# Altium footprint library PCB_Lib_Devzone.PcbLib: 491 footprints (part 7 of 31)
Each footprint in its own frame and in the unit in brackets; x right, y up, seen from the top. Pads: shape width x height; smd on the part's side, far side on the other; paste and mask are expansions set on the pad; w line width, h text height; cw(c..) or ccw(c..) is an arc to the next point about the centre after c.
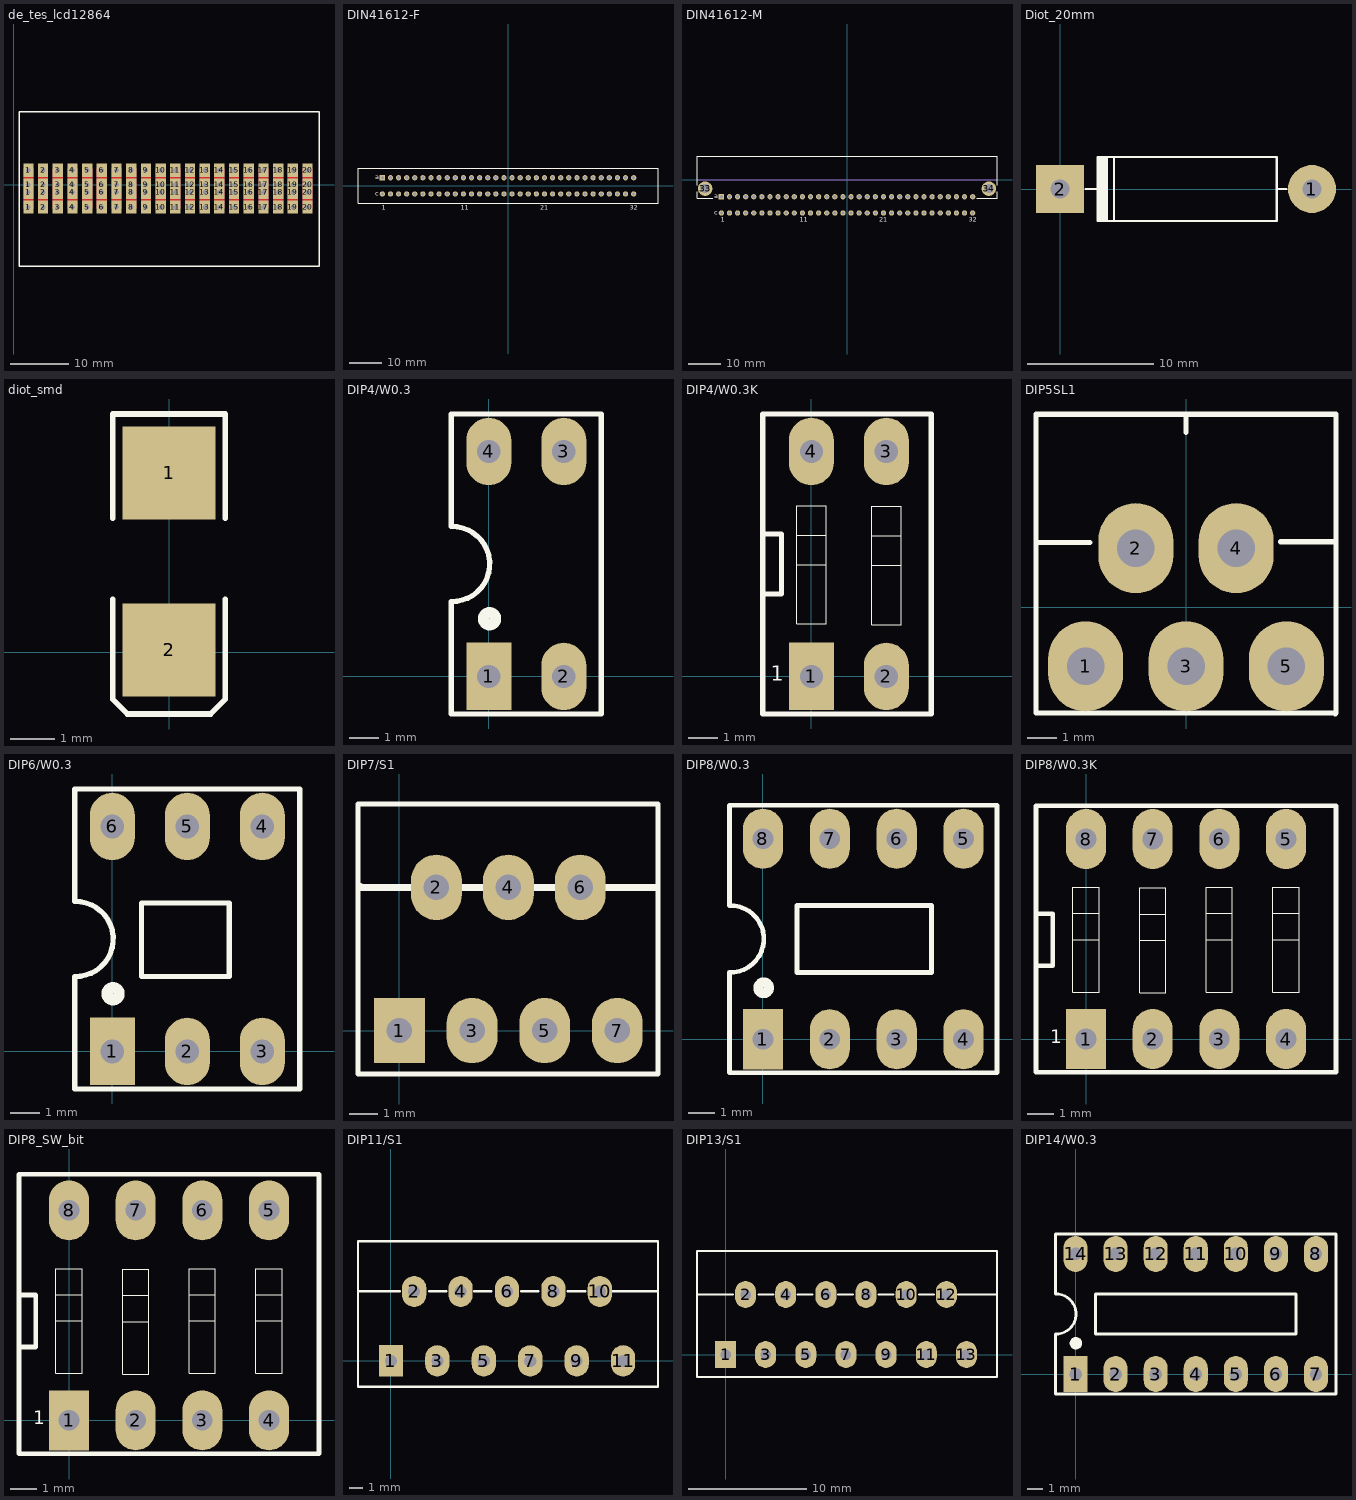
[diagram p6: the footprints below, top view; thin cyan lines are the x and y axes]

## de_tes_lcd12864 [mil]
pads (80):
  rect 70x90 hole 31.5: 1(100,-151.18) 1(100,-51.18) 1(100,0) 1(100,100) 2(200,-151.18) 2(200,-51.18) 2(200,0) 2(200,100) 3(300,-151.18) 3(300,-51.18) 3(300,0) 3(300,100) 4(400,-151.18) 4(400,-51.18) 4(400,0) 4(400,100) 5(500,-151.18) 5(500,-51.18) 5(500,0) 5(500,100) 6(600,-151.18) 6(600,-51.18) 6(600,0) 6(600,100) 7(700,-151.18) 7(700,-51.18) 7(700,0) 7(700,100) 8(800,-151.18) 8(800,-51.18) 8(800,0) 8(800,100) 9(900,-151.18) 9(900,-51.18) 9(900,0) 9(900,100) 10(1000,-151.18) 10(1000,-51.18) 10(1000,0) 10(1000,100) 11(1100,-151.18) 11(1100,-51.18) 11(1100,0) 11(1100,100) 12(1200,-151.18) 12(1200,-51.18) 12(1200,0) 12(1200,100) 13(1300,-151.18) 13(1300,-51.18) 13(1300,0) 13(1300,100) 14(1400,-151.18) 14(1400,-51.18) 14(1400,0) 14(1400,100) 15(1500,-151.18) 15(1500,-51.18) 15(1500,0) 15(1500,100) 16(1600,-151.18) 16(1600,-51.18) 16(1600,0) 16(1600,100) 17(1700,-151.18) 17(1700,-51.18) 17(1700,0) 17(1700,100) 18(1800,-151.18) 18(1800,-51.18) 18(1800,0) 18(1800,100) 19(1900,-151.18) 19(1900,-51.18) 19(1900,0) 19(1900,100) 20(2000,-151.18) 20(2000,-51.18) 20(2000,0) 20(2000,100)
Top Layer:
  lines w70: 100,-151.18 100,100 ; 200,-151.18 200,100 ; 300,-151.18 300,100 ; 400,-151.18 400,100 ; 500,-151.18 500,100 ; 600,-151.18 600,100 ; 700,-151.18 700,100 ; 800,-151.18 800,100 ; 900,-151.18 900,100 ; 1000,-151.18 1000,100 ; 1100,-151.18 1100,100 ; 1200,-151.18 1200,100 ; 1300,-151.18 1300,100 ; 1400,-151.18 1400,100 ; 1500,-151.18 1500,100 ; 1600,-151.18 1600,100 ; 1700,-151.18 1700,100 ; 1800,-151.18 1800,100 ; 1900,-151.18 1900,100 ; 2000,-151.18 2000,100
Bottom Layer:
  lines w50: 1500,-151.18 1500,-51.18 1500,0 ; 1600,-151.18 1600,-51.18 1600,100 ; 1700,-151.18 1700,100 ; 1802,-151.18 1802,114 ; 1900,-151.18 1900,100 ; 2000,-151.18 2000,-51.18 ; 2000,100 2000,0 ; 2000,-51.18 2000,0 ; 2000,-51.18 2000,0
  lines w70: 100,-151.18 100,100 ; 200,-151.18 200,100 ; 300,-151.18 300,100 ; 400,-151.18 400,100 ; 500,-151.18 500,100 ; 600,-151.18 600,100 ; 700,-151.18 700,100 ; 800,-151.18 800,100 ; 900,-151.18 900,100 ; 1000,-151.18 1000,100 ; 1100,-151.18 1100,100 ; 1200,-151.18 1200,100 ; 1300,-151.18 1300,100 ; 1400,-151.18 1400,100 ; 1500,-151.18 1500,-51.18 ; 1500,-5 1500,100 ; 1600,-151.18 1600,-51.18 ; 1600,0 1600,100 ; 1700,-151.18 1700,-51.18 ; 1700,0 1700,100 ; 1800,-151.18 1800,-51.18 ; 1800,0 1800,100 ; 1900,-151.18 1900,-51.18 ; 1900,0 1900,100 ; 2000,-151.18 2000,100
Top Overlay:
  lines w10: 36,-555 2078,-555 2078,499 1600,499 36,499 36,-555
3D body "female_header_a-bl254-da-g04d.stp": height 198.43, standoff -124.41, extent 44.16,-10.03 254,486.03
3D body "female_header_a-bl254-da-g04d.stp": height 198.43, standoff -124.41, extent 247,-10.03 456.84,486.03
3D body "female_header_a-bl254-da-g04d.stp": height 198.43, standoff -124.41, extent 448,-10.03 657.84,486.03
3D body "female_header_a-bl254-da-g04d.stp": height 198.43, standoff -124.41, extent 650,-10.03 859.84,486.03
3D body "female_header_a-bl254-da-g04d.stp": height 198.43, standoff -124.41, extent 1045.16,-10.03 1255,486.03
3D body "female_header_a-bl254-da-g04d.stp": height 198.43, standoff -124.41, extent 1246,-10.03 1455.84,486.03
3D body "female_header_a-bl254-da-g04d.stp": height 198.43, standoff -124.41, extent 1446,-10.03 1655.84,486.03
3D body "female_header_a-bl254-da-g04d.stp": height 198.43, standoff -124.41, extent 1641.16,-10.03 1851,486.03
3D body "female_header_a-bl254-da-g04d.stp": height 198.43, standoff -124.41, extent 1852.16,-10.03 2062,486.03
3D body "female_header_a-bl254-da-g04d.stp": height 198.43, standoff -124.41, extent 841,-10.03 1050.84,486.03
3D body "female_header_a-bl254-da-g04d.stp": height 198.43, standoff -124.41, extent 1048.6,-540.03 1258.45,-43.97
3D body "female_header_a-bl254-da-g04d.stp": height 198.43, standoff -124.41, extent 44.16,-540.03 254,-43.97
3D body "female_header_a-bl254-da-g04d.stp": height 198.43, standoff -124.41, extent 245.05,-540.03 454.89,-43.97
3D body "female_header_a-bl254-da-g04d.stp": height 198.43, standoff -124.41, extent 445.94,-540.03 655.78,-43.97
3D body "female_header_a-bl254-da-g04d.stp": height 198.43, standoff -124.41, extent 646.83,-540.03 856.67,-43.97
3D body "female_header_a-bl254-da-g04d.stp": height 198.43, standoff -124.41, extent 847.71,-540.03 1057.56,-43.97
3D body "female_header_a-bl254-da-g04d.stp": height 198.43, standoff -124.41, extent 1249.49,-540.03 1459.33,-43.97
3D body "female_header_a-bl254-da-g04d.stp": height 198.43, standoff -124.41, extent 1450.38,-540.03 1660.22,-43.97
3D body "female_header_a-bl254-da-g04d.stp": height 198.43, standoff -124.41, extent 1651.27,-540.03 1861.11,-43.97
3D body "female_header_a-bl254-da-g04d.stp": height 198.43, standoff -124.41, extent 1852.16,-540.03 2062,-43.97

## DIN41612-F [mm] "Connector; DIN 41612, Type C, Thru-Hole; Rows a+c, 64 Position; Vertical; No Mounting Fixture"
height 13
pads (64):
  rect 1.65x1.65 hole 1: A1(-39.37,2.54)
  round 1.65 hole 1: A2(-36.83,2.54) A3(-34.29,2.54) A4(-31.75,2.54) A5(-29.21,2.54) A6(-26.67,2.54) A7(-24.13,2.54) A8(-21.59,2.54) A9(-19.05,2.54) A10(-16.51,2.54) A11(-13.97,2.54) A12(-11.43,2.54) A13(-8.89,2.54) A14(-6.35,2.54) A15(-3.81,2.54) A16(-1.27,2.54) A17(1.27,2.54) A18(3.81,2.54) A19(6.35,2.54) A20(8.89,2.54) A21(11.43,2.54) A22(13.97,2.54) A23(16.51,2.54) A24(19.05,2.54) A25(21.59,2.54) A26(24.13,2.54) A27(26.67,2.54) A28(29.21,2.54) A29(31.75,2.54) A30(34.29,2.54) A31(36.83,2.54) A32(39.37,2.54) C1(-39.37,-2.54) C2(-36.83,-2.54) C3(-34.29,-2.54) C4(-31.75,-2.54) C5(-29.21,-2.54) C6(-26.67,-2.54) C7(-24.13,-2.54) C8(-21.59,-2.54) C9(-19.05,-2.54) C10(-16.51,-2.54) C11(-13.97,-2.54) C12(-11.43,-2.54) C13(-8.89,-2.54) C14(-6.35,-2.54) C15(-3.81,-2.54) C16(-1.27,-2.54) C17(1.27,-2.54) C18(3.81,-2.54) C19(6.35,-2.54) C20(8.89,-2.54) C21(11.43,-2.54) C22(13.97,-2.54) C23(16.51,-2.54) C24(19.05,-2.54) C25(21.59,-2.54) C26(24.13,-2.54) C27(26.67,-2.54) C28(29.21,-2.54) C29(31.75,-2.54) C30(34.29,-2.54) C31(36.83,-2.54) C32(39.37,-2.54)
Top Overlay:
  lines w0.2: -47,-5.5 -47,5.5 47,5.5 47,-5.5 -47,-5.5
  text "21" at 10.18,-7.5 h1.5
  text "11" at -14.82,-7.5 h1.5
  text "32" at 38.12,-7.5 h1.5
  text "c" at -41.58,-3.04 h1.5
  text "a" at -41.58,2.04 h1.5
  text "1" at -39.62,-7.5 h1.5

## DIN41612-M [mm] "Connector; DIN 41612, Type C, Thru-Hole; Rows a+c, 64 Position; Right Angle"
height 11.1
pads (66):
  round 4.6 hole 2.8: 33(-44.45,-2.76) 34(44.45,-2.76)
  rect 1.65x1.65 hole 1: A1(-39.37,-5.3)
  round 1.65 hole 1: A2(-36.83,-5.3) A3(-34.29,-5.3) A4(-31.75,-5.3) A5(-29.21,-5.3) A6(-26.67,-5.3) A7(-24.13,-5.3) A8(-21.59,-5.3) A9(-19.05,-5.3) A10(-16.51,-5.3) A11(-13.97,-5.3) A12(-11.43,-5.3) A13(-8.89,-5.3) A14(-6.35,-5.3) A15(-3.81,-5.3) A16(-1.27,-5.3) A17(1.27,-5.3) A18(3.81,-5.3) A19(6.35,-5.3) A20(8.89,-5.3) A21(11.43,-5.3) A22(13.97,-5.3) A23(16.51,-5.3) A24(19.05,-5.3) A25(21.59,-5.3) A26(24.13,-5.3) A27(26.67,-5.3) A28(29.21,-5.3) A29(31.75,-5.3) A30(34.29,-5.3) A31(36.83,-5.3) A32(39.37,-5.3) C1(-39.37,-10.38) C2(-36.83,-10.38) C3(-34.29,-10.38) C4(-31.75,-10.38) C5(-29.21,-10.38) C6(-26.67,-10.38) C7(-24.13,-10.38) C8(-21.59,-10.38) C9(-19.05,-10.38) C10(-16.51,-10.38) C11(-13.97,-10.38) C12(-11.43,-10.38) C13(-8.89,-10.38) C14(-6.35,-10.38) C15(-3.81,-10.38) C16(-1.27,-10.38) C17(1.27,-10.38) C18(3.81,-10.38) C19(6.35,-10.38) C20(8.89,-10.38) C21(11.43,-10.38) C22(13.97,-10.38) C23(16.51,-10.38) C24(19.05,-10.38) C25(21.59,-10.38) C26(24.13,-10.38) C27(26.67,-10.38) C28(29.21,-10.38) C29(31.75,-10.38) C30(34.29,-10.38) C31(36.83,-10.38) C32(39.37,-10.38)
Top Overlay:
  lines w0.2: -47,-3.76 -47,-5.8 -42.07,-5.8 ; -47,-1.76 -47,7.34 47,7.34 47,-1.76 ; 40.595,-5.8 47,-5.8 47,-3.76
  text "21" at 10.18,-13.08 h1.5
  text "11" at -14.845,-13.08 h1.5
  text "32" at 38.12,-13.08 h1.5
  text "c" at -41.58,-10.88 h1.5
  text "a" at -41.58,-5.8 h1.5
  text "1" at -39.62,-13.08 h1.5
Mechanical 1:
  lines w0.1: -47,0 47,0
  text "PCB Edge" at -46.47,0.5 h0.6

## Diot_20mm [mil]
pads (2):
  round 150 hole 60: 1(787.4,0)
  rect 150x150 hole 60: 2(0,0)
Top Overlay:
  rectangle: 120,-100 150,100
  lines w7: 80,0 118,0 ; 118,-44 118,0 ; 118,46 118,0 ; 169,-99 169,100 ; 677,0 707,0 ; 118,-100 118,100 677,100 677,-100 118,-100

## diot_smd [mm]
pads (2):
  rect 2.1x2.1 smd: 1(0,4.053) 2(0,0.053)
Top Overlay:
  lines w0.127: -1.27,1.194 -1.27,-1.067 -0.94,-1.397 0.94,-1.397 1.27,-1.067 1.27,-0.425 1.27,1.168 1.27,1.194 ; -1.27,3.024 -1.27,5.385 1.27,5.385 1.27,3.024
3D body "User Library-SMAJ.STEP": height 2.04, standoff 0.05, extent -1.295,-0.002 1.245,4.928

## DIP4/W0.3 [mil] "4 PIN, W 300mil, Pin to pin 100mil"
height 100
pads (4):
  rect 60x90 hole 31: 1(0,0)
  oval 60x90 hole 31: 2(100,0) 3(100,300) 4(0,300)
Top Overlay:
  circle w15: c1,77 r8
  lines w7: -50.38,100.05 ccw(c-48.69,150.02) -50,200 ; -50,100 -50,-50 150,-50 150,350 -50,350 -50,201
3D body "SW3DPS-DIP4-DEFAULT.STEP": height 169.69, standoff -129.13, extent -59.06,-10 159.06,304.96

## DIP4/W0.3K [mil] "4 PIN, W 400mil , L 450mil,Pin to pin 100mil"
height 100
pads (4):
  rect 60x90 hole 31: 1(0,0)
  oval 60x90 hole 31: 2(100,0) 3(100,300) 4(0,300)
Top Overlay:
  lines w1.5: -19.68,149 19.68,149 ; -19.68,188.37 19.68,188.37 ; 80.31,148 119.69,148 ; 80.31,187.37 119.69,187.37 ; -19.68,70.26 -19.68,227.74 19.68,227.74 19.68,70.26 -19.68,70.26 ; 80.31,69.26 80.31,226.74 119.69,226.74 119.69,69.26 80.31,69.26
  lines w7: -65,110 -40,110 -40,190 -65,190 ; -65,-50 -65,350 160,350 160,-50 -65,-50
  text "1" at -54,-6 h20
3D body "User Library-Switch-Piano-DIP-2.STEP": height 354.33, standoff -157.48, extent -66.22,-103.43 170,343.43

## DIP5SL1 [mm]
pads (5):
  oval 2.54x3.048 hole 1.27: 1(-3.4,-2) 2(-1.7,2) 3(0,-2) 4(1.7,2) 5(3.4,-2)
Top Overlay:
  lines w0.178: -5.076,2.191 -3.248,2.191 ; 0,5.918 0,6.502 ; 3.204,2.216 5.033,2.216 ; -5.08,-3.581 5.029,-3.581 5.055,-3.607 5.08,-3.581 5.08,6.534 -5.08,6.534 -5.08,-3.581
3D body "TO220-5.STEP": height 18.81, standoff -9.47, extent -4.993,-2.246 5.207,6.31

## DIP6/W0.3 [mil] "6 PIN, W 300mil, Pin to pin 100mil"
height 100
pads (6):
  rect 60x90 hole 31.5: 1(0,0)
  oval 60x90 hole 31.5: 2(100,0) 3(200,0) 4(200,300) 5(100,300) 6(0,300)
Top Overlay:
  circle w15: c1,77 r8
  lines w7: -50.38,100.05 ccw(c-48.69,150.02) -50,200 ; -50,100 -50,-50 250,-50 250,350 -50,350 -50,201 ; 39,100 39,198 156,198 156,100 39,100
3D body "SW3DPS-DIP6-DEFAULT.STEP": height 169.69, standoff -129.13, extent -58.11,-7.48 260,307.48

## DIP7/S1 [mil]
pads (7):
  rect 70x90 hole 35: 1(0,0)
  oval 70x90 hole 35: 2(51,197) 3(100,0) 4(150,197) 5(200,0) 6(249,197) 7(300,0)
Top Overlay:
  lines w7: -57,-60 356,-60 356,312 -57,312 -57,-60
  lines w10: -54,198 -54,197 354,197
3D body "User Library-TO-220(T).STEP": height 756.77, standoff -77.87, extent -50.57,-11.02 351,311.02

## DIP8/W0.3 [mil] "8 PIN, W 300mil, Pin to pin 100mil"
height 100
pads (8):
  rect 60x90 hole 31: 1(0,0)
  oval 60x90 hole 31: 2(100,0) 3(200,0) 4(300,0) 5(300,300) 6(200,300) 7(100,300) 8(0,300)
Top Overlay:
  circle w15: c1,77 r8
  lines w7: -50.38,100.05 ccw(c-48.69,150.02) -50,200 ; -50,100 -50,-50 350,-50 350,350 -50,350 -50,201 ; 51,100 51,200 252,200 252,100 51,100
3D body "SW3dPS-DIP8-CER.STEP": height 201.25, standoff -129.47, extent -50,-40 350,336.4

## DIP8/W0.3K [mil] "8 PIN, W 400mil , L 450mil, Pin to pin 100mil For Switch"
height 100
pads (8):
  rect 60x90 hole 31: 1(0,0)
  oval 60x90 hole 31: 2(100,0) 3(200,0) 4(300,0) 5(300,300) 6(200,300) 7(100,300) 8(0,300)
Top Overlay:
  lines w1.5: -19.68,149 19.68,149 ; -19.68,188.37 19.68,188.37 ; 80.31,148 119.69,148 ; 80.31,187.37 119.69,187.37 ; 180.31,149 219.69,149 ; 180.31,188.37 219.69,188.37 ; 280.31,149 319.69,149 ; 280.31,188.37 319.69,188.37 ; -19.68,70.26 -19.68,227.74 19.68,227.74 19.68,70.26 -19.68,70.26 ; 80.31,69.26 80.31,226.74 119.69,226.74 119.69,69.26 80.31,69.26 ; 180.31,70.26 180.31,227.74 219.69,227.74 219.69,70.26 180.31,70.26 ; 280.31,70.26 280.31,227.74 319.69,227.74 319.69,70.26 280.31,70.26
  lines w7: -75,68.5 -75,233 ; -75,110 -50,110 -50,188 -74,188 -75,189 ; -75,126 -75,-50 375,-50 375,350 -75,350 -75,176
  text "1" at -54,-6 h20
3D body "switch 4bank x1.STEP": height 158.27, standoff -9.84, extent -80,-45.08 377.87,345.08

## DIP8_SW_bit [mil]
pads (8):
  rect 60x90 hole 31: 1(0,0)
  oval 60x90 hole 31: 2(100,0) 3(200,0) 4(300,0) 5(300,314.96) 6(200,314.96) 7(100,314.96) 8(0,314.96)
Top Overlay:
  lines w1.5: -19.68,149 19.68,149 ; -19.68,188.37 19.68,188.37 ; 80.31,148 119.69,148 ; 80.31,187.37 119.69,187.37 ; 180.31,149 219.69,149 ; 180.31,188.37 219.69,188.37 ; 280.31,149 319.69,149 ; 280.31,188.37 319.69,188.37 ; -19.68,70.26 19.68,70.26 19.68,227.74 -19.68,227.74 -19.68,70.26 ; 80.31,69.26 119.69,69.26 119.69,226.74 80.31,226.74 80.31,69.26 ; 180.31,70.26 219.69,70.26 219.69,227.74 180.31,227.74 180.31,70.26 ; 280.31,70.26 319.69,70.26 319.69,227.74 280.31,227.74 280.31,70.26
  lines w7: -75,68.5 -75,233 ; -75,110 -50,110 -50,188 -74,188 -75,189 ; -75,126 -75,-50 375,-50 375,369 -75,369 -75,176
  text "1" at -54,-6 h20
3D body "switch 4bank x1.STEP": height 158.27, standoff -9.84, extent -79.93,-36.08 377.94,354.08

## DIP11/S1 [mil] "11 Pin so le hai hang cach nhau 200mil., Pin to pin 100mil"
pads (11):
  rect 70x90 hole 35: 1(0,0)
  oval 70x90 hole 35: 2(66.93,200) 3(133.86,0) 4(200.79,200) 5(267.72,0) 6(334.65,200) 7(401.57,0) 8(468.5,200) 9(535.43,0) 10(602.36,200) 11(669.29,0)
Top Overlay:
  lines w7: -95,200 25,200 ; 110,200 160,200 ; 240,200 290,200 ; 375,200 425,200 ; 510,200 560,200 ; 630,200 770,200 ; -95,-75 770,-75 770,345 -95,345 -95,-75

## DIP13/S1 [mil] "13 Pin so le hai hang cach nhau 200mil., Pin to pin 100mil"
pads (13):
  rect 70x90 hole 35: 1(0,0)
  oval 70x90 hole 35: 2(66.93,200) 3(133.86,0) 4(200.79,200) 5(267.72,0) 6(334.65,200) 7(401.57,0) 8(468.5,200) 9(535.43,0) 10(602.36,200) 11(669.29,0) 12(736.22,200) 13(803.15,0)
Top Overlay:
  lines w7: -95,200 25,200 ; 110,200 160,200 ; 240,200 290,200 ; 375,200 425,200 ; 510,200 560,200 ; 645,200 695,200 ; 775,200 905,200 ; -95,-75 -95,345 905,345 905,-75 -95,-75

## DIP14/W0.3 [mil] "14PIN, W 300mil, Pin to pin 100mil"
height 100
pads (14):
  rect 60x90 hole 31: 1(0,0)
  oval 60x90 hole 31: 2(100,0) 3(200,0) 4(300,0) 5(400,0) 6(500,0) 7(600,0) 8(600,300) 9(500,300) 10(400,300) 11(300,300) 12(200,300) 13(100,300) 14(0,300)
Top Overlay:
  circle w15: c1,77 r8
  lines w7: -50.38,100.05 ccw(c-48.69,150.02) -50,200 ; -50,100 -50,-50 650,-50 650,350 -50,350 -50,201 ; 50,100 550,100 550,200 50,200 50,100
3D body "SW3DPS-DIP-14-DEFAULT.STEP": height 145.48, standoff -129.32, extent -69.99,-12.47 680.01,302.49